# Altium footprint library Разъемы.PcbLib: 291 footprints (part 14 of 19)
Each footprint in its own frame and in the unit in brackets; x right, y up, seen from the top. Pads: shape width x height; smd on the part's side, far side on the other; paste and mask are expansions set on the pad; w line width, h text height; cw(c..) or ccw(c..) is an arc to the next point about the centre after c.
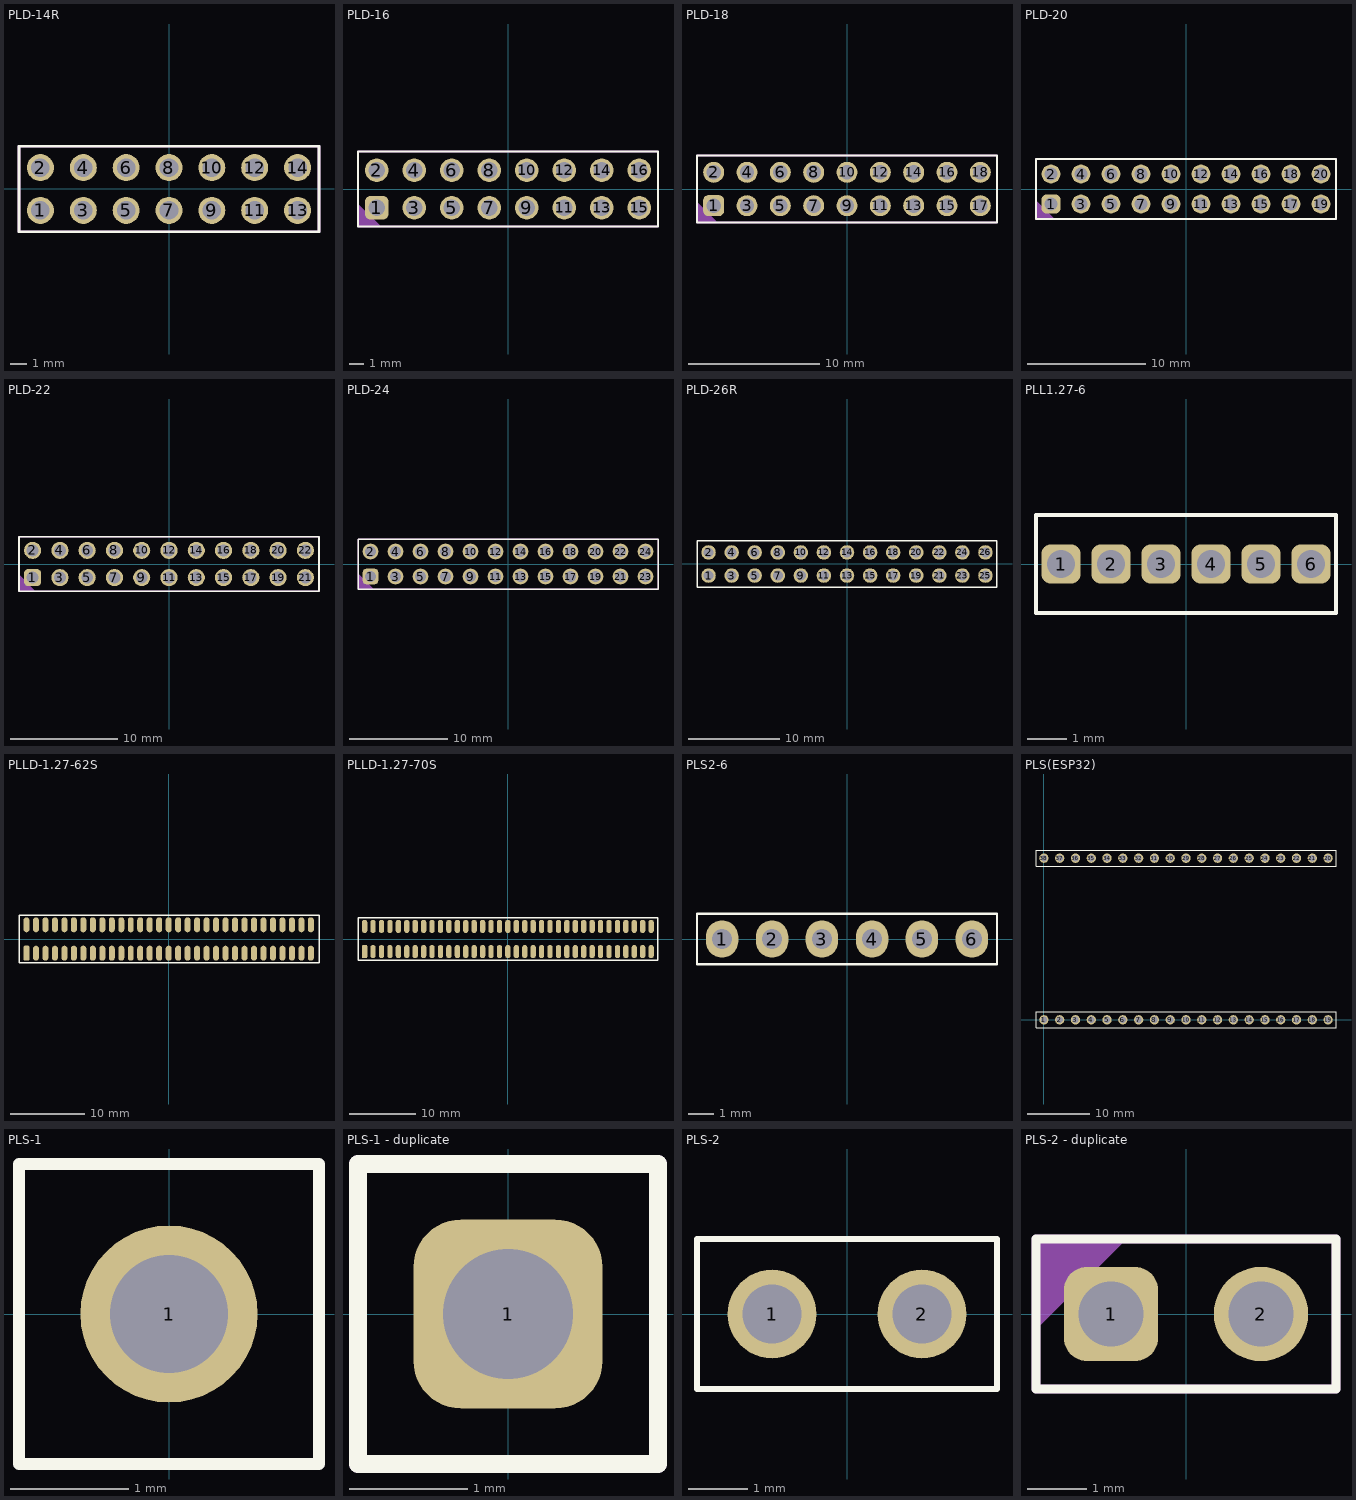
[diagram p13: the footprints below, top view; thin cyan lines are the x and y axes]

## PLD-14R [mm]
height 8
pads (14):
  round 1.6 hole 1.1: 1(-7.62,-1.27) 2(-7.62,1.27) 3(-5.08,-1.27) 4(-5.08,1.27) 5(-2.54,-1.27) 6(-2.54,1.27) 7(0,-1.27) 8(0,1.27) 9(2.54,-1.27) 10(2.54,1.27) 11(5.08,-1.27) 12(5.08,1.27) 13(7.62,-1.27) 14(7.62,1.27)
Top Overlay:
  lines w0.15: -8.89,-2.54 8.89,-2.54 8.89,2.54 -8.89,2.54 -8.89,-2.54
  text "." at -9.5,-1.75 h0.1
Top Designator:
  text ".Designator" at -4.516,-4.594 h0.8
Mechanical 29:
  lines w0.15: -8.89,-2.54 -8.89,2.54 8.89,2.54 8.89,-2.54 -8.89,-2.54
3D body "61301421021.stp": height 5.04, standoff -3.04, extent -8.89,-11.27 8.89,1.63

## PLD-16 [mm]
height 8
pads (16):
  rrect50% 1.6x1.6 hole 1.1: 1(-8.89,-1.27)
  round 1.6 hole 1.1: 2(-8.89,1.27) 3(-6.35,-1.27) 4(-6.35,1.27) 5(-3.81,-1.27) 6(-3.81,1.27) 7(-1.27,-1.27) 8(-1.27,1.27) 9(1.27,-1.27) 10(1.27,1.27) 11(3.81,-1.27) 12(3.81,1.27) 13(6.35,-1.27) 14(6.35,1.27) 15(8.89,-1.27) 16(8.89,1.27)
Top Overlay:
  lines w0.15: -10.16,-2.54 10.16,-2.54 10.16,2.54 -10.16,2.54 -10.16,-2.54
Top Designator:
  text ".Designator" at -3.999,-0.267 h0.8
Mechanical 29:
  region: -10.16,-2.54 -10.16,-1.016 -8.636,-2.54
  lines w0.15: -10.16,-2.54 -10.16,2.54 10.16,2.54 10.16,-2.54 -10.16,-2.54
  text ".Designator" at -2.5,-0.3 h1
3D body "PLS-1.STEP": height 8.5, standoff -3, extent 5.08,-2.54 7.62,0
3D body "PLS-1.STEP": height 8.5, standoff -3, extent 7.62,-2.54 10.16,0
3D body "PLS-1.STEP": height 8.5, standoff -3, extent 7.62,0 10.16,2.54
3D body "PLS-1.STEP": height 8.5, standoff -3, extent 5.08,0 7.62,2.54
3D body "PLS-1.STEP": height 8.5, standoff -3, extent 2.54,-2.54 5.08,0
3D body "PLS-1.STEP": height 8.5, standoff -3, extent 2.54,0 5.08,2.54
3D body "PLS-1.STEP": height 8.5, standoff -3, extent 0,-2.54 2.54,0
3D body "PLS-1.STEP": height 8.5, standoff -3, extent 0,0 2.54,2.54
3D body "PLS-1.STEP": height 8.5, standoff -3, extent -2.54,-2.54 0,0
3D body "PLS-1.STEP": height 8.5, standoff -3, extent -2.54,0 0,2.54
3D body "PLS-1.STEP": height 8.5, standoff -3, extent -5.08,-2.54 -2.54,0
3D body "PLS-1.STEP": height 8.5, standoff -3, extent -5.08,0 -2.54,2.54
3D body "PLS-1.STEP": height 8.5, standoff -3, extent -7.62,-2.54 -5.08,0
3D body "PLS-1.STEP": height 8.5, standoff -3, extent -7.62,0 -5.08,2.54
3D body "PLS-1.STEP": height 8.5, standoff -3, extent -10.16,0 -7.62,2.54
3D body "PLS-1.STEP": height 8.5, standoff -3, extent -10.16,-2.54 -7.62,0

## PLD-18 [mm]
height 8
pads (18):
  rrect50% 1.6x1.6 hole 1.1: 1(-10.16,-1.27)
  round 1.6 hole 1.1: 2(-10.16,1.27) 3(-7.62,-1.27) 4(-7.62,1.27) 5(-5.08,-1.27) 6(-5.08,1.27) 7(-2.54,-1.27) 8(-2.54,1.27) 9(0,-1.27) 10(0,1.27) 11(2.54,-1.27) 12(2.54,1.27) 13(5.08,-1.27) 14(5.08,1.27) 15(7.62,-1.27) 16(7.62,1.27) 17(10.16,-1.27) 18(10.16,1.27)
Top Overlay:
  lines w0.15: -11.43,-2.54 -11.43,2.54 11.43,2.54 11.43,-2.54 -11.43,-2.54
Top Designator:
  text ".Designator" at -3.999,-0.267 h0.8
Mechanical 29:
  region: -11.43,-2.54 -11.43,-1.016 -9.906,-2.54
  lines w0.15: -11.43,-2.54 11.43,-2.54 11.43,2.54 -11.43,2.54 -11.43,-2.54
  text ".Designator" at -3,-0.3 h1
3D body "PLS-1.STEP": height 8.5, standoff -3, extent -11.43,-2.54 -8.89,0
3D body "PLS-1.STEP": height 8.5, standoff -3, extent -11.43,0 -8.89,2.54
3D body "PLS-1.STEP": height 8.5, standoff -3, extent -8.89,0 -6.35,2.54
3D body "PLS-1.STEP": height 8.5, standoff -3, extent -8.89,-2.54 -6.35,0
3D body "PLS-1.STEP": height 8.5, standoff -3, extent -6.35,0 -3.81,2.54
3D body "PLS-1.STEP": height 8.5, standoff -3, extent -6.35,-2.54 -3.81,0
3D body "PLS-1.STEP": height 8.5, standoff -3, extent -3.81,0 -1.27,2.54
3D body "PLS-1.STEP": height 8.5, standoff -3, extent -3.81,-2.54 -1.27,0
3D body "PLS-1.STEP": height 8.5, standoff -3, extent -1.27,0 1.27,2.54
3D body "PLS-1.STEP": height 8.5, standoff -3, extent -1.27,-2.54 1.27,0
3D body "PLS-1.STEP": height 8.5, standoff -3, extent 1.27,0 3.81,2.54
3D body "PLS-1.STEP": height 8.5, standoff -3, extent 1.27,-2.54 3.81,0
3D body "PLS-1.STEP": height 8.5, standoff -3, extent 3.81,0 6.35,2.54
3D body "PLS-1.STEP": height 8.5, standoff -3, extent 6.35,0 8.89,2.54
3D body "PLS-1.STEP": height 8.5, standoff -3, extent 8.89,0 11.43,2.54
3D body "PLS-1.STEP": height 8.5, standoff -3, extent 8.89,-2.54 11.43,0
3D body "PLS-1.STEP": height 8.5, standoff -3, extent 6.35,-2.54 8.89,0
3D body "PLS-1.STEP": height 8.5, standoff -3, extent 3.81,-2.54 6.35,0

## PLD-20 [mm]
height 8
pads (20):
  rrect50% 1.6x1.6 hole 1.1: 1(-11.43,-1.27)
  round 1.6 hole 1.1: 2(-11.43,1.27) 3(-8.89,-1.27) 4(-8.89,1.27) 5(-6.35,-1.27) 6(-6.35,1.27) 7(-3.81,-1.27) 8(-3.81,1.27) 9(-1.27,-1.27) 10(-1.27,1.27) 11(1.27,-1.27) 12(1.27,1.27) 13(3.81,-1.27) 14(3.81,1.27) 15(6.35,-1.27) 16(6.35,1.27) 17(8.89,-1.27) 18(8.89,1.27) 19(11.43,-1.27) 20(11.43,1.27)
Top Overlay:
  lines w0.15: -12.7,-2.54 -12.7,2.54 12.7,2.54 12.7,-2.54 -12.7,-2.54
Top Designator:
  text ".Designator" at -3.999,-0.267 h0.8
Mechanical 29:
  region: -12.7,-2.54 -12.7,-1.016 -11.176,-2.54
  lines w0.15: -12.7,-2.54 12.7,-2.54 12.7,2.54 -12.7,2.54 -12.7,-2.54
  text ".Designator" at -4,-0.3 h1
3D body "PLS-1.STEP": height 8.5, standoff -3, extent -12.7,-2.54 -10.16,0
3D body "PLS-1.STEP": height 8.5, standoff -3, extent -12.7,0 -10.16,2.54
3D body "PLS-1.STEP": height 8.5, standoff -3, extent -10.16,0 -7.62,2.54
3D body "PLS-1.STEP": height 8.5, standoff -3, extent -10.16,-2.54 -7.62,0
3D body "PLS-1.STEP": height 8.5, standoff -3, extent -7.62,0 -5.08,2.54
3D body "PLS-1.STEP": height 8.5, standoff -3, extent -7.62,-2.54 -5.08,0
3D body "PLS-1.STEP": height 8.5, standoff -3, extent -5.08,0 -2.54,2.54
3D body "PLS-1.STEP": height 8.5, standoff -3, extent -5.08,-2.54 -2.54,0
3D body "PLS-1.STEP": height 8.5, standoff -3, extent -2.54,0 0,2.54
3D body "PLS-1.STEP": height 8.5, standoff -3, extent -2.54,-2.54 0,0
3D body "PLS-1.STEP": height 8.5, standoff -3, extent 0,0 2.54,2.54
3D body "PLS-1.STEP": height 8.5, standoff -3, extent 0,-2.54 2.54,0
3D body "PLS-1.STEP": height 8.5, standoff -3, extent 2.54,0 5.08,2.54
3D body "PLS-1.STEP": height 8.5, standoff -3, extent 5.08,0 7.62,2.54
3D body "PLS-1.STEP": height 8.5, standoff -3, extent 7.62,0 10.16,2.54
3D body "PLS-1.STEP": height 8.5, standoff -3, extent 10.16,0 12.7,2.54
3D body "PLS-1.STEP": height 8.5, standoff -3, extent 10.16,-2.54 12.7,0
3D body "PLS-1.STEP": height 8.5, standoff -3, extent 7.62,-2.54 10.16,0
3D body "PLS-1.STEP": height 8.5, standoff -3, extent 5.08,-2.54 7.62,0
3D body "PLS-1.STEP": height 8.5, standoff -3, extent 2.54,-2.54 5.08,0

## PLD-22 [mm]
height 8
pads (22):
  rrect50% 1.6x1.6 hole 1.1: 1(-12.7,-1.27)
  round 1.6 hole 1.1: 2(-12.7,1.27) 3(-10.16,-1.27) 4(-10.16,1.27) 5(-7.62,-1.27) 6(-7.62,1.27) 7(-5.08,-1.27) 8(-5.08,1.27) 9(-2.54,-1.27) 10(-2.54,1.27) 11(0,-1.27) 12(0,1.27) 13(2.54,-1.27) 14(2.54,1.27) 15(5.08,-1.27) 16(5.08,1.27) 17(7.62,-1.27) 18(7.62,1.27) 19(10.16,-1.27) 20(10.16,1.27) 21(12.7,-1.27) 22(12.7,1.27)
Top Overlay:
  lines w0.15: -13.97,-2.54 -13.97,2.54 13.97,2.54 13.97,-2.54 -13.97,-2.54
Top Designator:
  text ".Designator" at -3.999,-0.267 h0.8
Mechanical 29:
  region: -13.97,-2.54 -13.97,-1.016 -12.446,-2.54
  lines w0.15: -13.97,-2.54 13.97,-2.54 13.97,2.54 -13.97,2.54 -13.97,-2.54
  text ".Designator" at -3.5,-0.3 h1
3D body "PLS-1.STEP": height 8.5, standoff -3, extent -13.97,-2.54 -11.43,0
3D body "PLS-1.STEP": height 8.5, standoff -3, extent -13.97,0 -11.43,2.54
3D body "PLS-1.STEP": height 8.5, standoff -3, extent -11.43,0 -8.89,2.54
3D body "PLS-1.STEP": height 8.5, standoff -3, extent -11.43,-2.54 -8.89,0
3D body "PLS-1.STEP": height 8.5, standoff -3, extent -8.89,0 -6.35,2.54
3D body "PLS-1.STEP": height 8.5, standoff -3, extent -8.89,-2.54 -6.35,0
3D body "PLS-1.STEP": height 8.5, standoff -3, extent -6.35,0 -3.81,2.54
3D body "PLS-1.STEP": height 8.5, standoff -3, extent -6.35,-2.54 -3.81,0
3D body "PLS-1.STEP": height 8.5, standoff -3, extent -3.81,0 -1.27,2.54
3D body "PLS-1.STEP": height 8.5, standoff -3, extent -3.81,-2.54 -1.27,0
3D body "PLS-1.STEP": height 8.5, standoff -3, extent -1.27,0 1.27,2.54
3D body "PLS-1.STEP": height 8.5, standoff -3, extent -1.27,-2.54 1.27,0
3D body "PLS-1.STEP": height 8.5, standoff -3, extent 1.27,0 3.81,2.54
3D body "PLS-1.STEP": height 8.5, standoff -3, extent 3.81,0 6.35,2.54
3D body "PLS-1.STEP": height 8.5, standoff -3, extent 6.35,0 8.89,2.54
3D body "PLS-1.STEP": height 8.5, standoff -3, extent 8.89,0 11.43,2.54
3D body "PLS-1.STEP": height 8.5, standoff -3, extent 11.43,0 13.97,2.54
3D body "PLS-1.STEP": height 8.5, standoff -3, extent 11.43,-2.54 13.97,0
3D body "PLS-1.STEP": height 8.5, standoff -3, extent 8.89,-2.54 11.43,0
3D body "PLS-1.STEP": height 8.5, standoff -3, extent 6.35,-2.54 8.89,0
3D body "PLS-1.STEP": height 8.5, standoff -3, extent 3.81,-2.54 6.35,0
3D body "PLS-1.STEP": height 8.5, standoff -3, extent 1.27,-2.54 3.81,0

## PLD-24 [mm]
height 8
pads (24):
  rrect50% 1.6x1.6 hole 1.1: 1(-13.97,-1.27)
  round 1.6 hole 1.1: 2(-13.97,1.27) 3(-11.43,-1.27) 4(-11.43,1.27) 5(-8.89,-1.27) 6(-8.89,1.27) 7(-6.35,-1.27) 8(-6.35,1.27) 9(-3.81,-1.27) 10(-3.81,1.27) 11(-1.27,-1.27) 12(-1.27,1.27) 13(1.27,-1.27) 14(1.27,1.27) 15(3.81,-1.27) 16(3.81,1.27) 17(6.35,-1.27) 18(6.35,1.27) 19(8.89,-1.27) 20(8.89,1.27) 21(11.43,-1.27) 22(11.43,1.27) 23(13.97,-1.27) 24(13.97,1.27)
Top Overlay:
  lines w0.15: -15.24,-2.54 15.24,-2.54 15.24,2.54 -15.24,2.54 -15.24,-2.54
Top Designator:
  text ".Designator" at -3.999,-0.267 h0.8
Mechanical 29:
  region: -15.24,-2.5 -15.24,-0.976 -13.716,-2.5
  lines w0.15: -15.24,-2.54 -15.24,2.54 15.24,2.54 15.24,-2.54 -15.24,-2.54
3D body "PLS-1.STEP": height 8.5, standoff -3, extent 0,-2.54 2.54,0
3D body "PLS-1.STEP": height 8.5, standoff -3, extent 2.54,-2.54 5.08,0
3D body "PLS-1.STEP": height 8.5, standoff -3, extent 5.08,-2.54 7.62,0
3D body "PLS-1.STEP": height 8.5, standoff -3, extent 7.62,-2.54 10.16,0
3D body "PLS-1.STEP": height 8.5, standoff -3, extent 10.16,-2.54 12.7,0
3D body "PLS-1.STEP": height 8.5, standoff -3, extent 12.7,-2.54 15.24,0
3D body "PLS-1.STEP": height 8.5, standoff -3, extent 12.7,0 15.24,2.54
3D body "PLS-1.STEP": height 8.5, standoff -3, extent 10.16,0 12.7,2.54
3D body "PLS-1.STEP": height 8.5, standoff -3, extent 7.62,0 10.16,2.54
3D body "PLS-1.STEP": height 8.5, standoff -3, extent 5.08,0 7.62,2.54
3D body "PLS-1.STEP": height 8.5, standoff -3, extent 2.54,0 5.08,2.54
3D body "PLS-1.STEP": height 8.5, standoff -3, extent 0,0 2.54,2.54
3D body "PLS-1.STEP": height 8.5, standoff -3, extent -2.54,-2.54 0,0
3D body "PLS-1.STEP": height 8.5, standoff -3, extent -2.54,0 0,2.54
3D body "PLS-1.STEP": height 8.5, standoff -3, extent -5.08,-2.54 -2.54,0
3D body "PLS-1.STEP": height 8.5, standoff -3, extent -5.08,0 -2.54,2.54
3D body "PLS-1.STEP": height 8.5, standoff -3, extent -7.62,-2.54 -5.08,0
3D body "PLS-1.STEP": height 8.5, standoff -3, extent -7.62,0 -5.08,2.54
3D body "PLS-1.STEP": height 8.5, standoff -3, extent -10.16,-2.54 -7.62,0
3D body "PLS-1.STEP": height 8.5, standoff -3, extent -10.16,0 -7.62,2.54
3D body "PLS-1.STEP": height 8.5, standoff -3, extent -12.7,-2.54 -10.16,0
3D body "PLS-1.STEP": height 8.5, standoff -3, extent -12.7,0 -10.16,2.54
3D body "PLS-1.STEP": height 8.5, standoff -3, extent -15.24,0 -12.7,2.54
3D body "PLS-1.STEP": height 8.5, standoff -3, extent -15.24,-2.54 -12.7,0

## PLD-26R [mm]
pads (26):
  round 1.6 hole 1.1: 1(-15.24,-1.29) 2(-15.24,1.25) 3(-12.7,-1.29) 4(-12.7,1.25) 5(-10.16,-1.29) 6(-10.16,1.25) 7(-7.62,-1.29) 8(-7.62,1.25) 9(-5.08,-1.29) 10(-5.08,1.25) 11(-2.54,-1.29) 12(-2.54,1.25) 13(0,-1.29) 14(0,1.25) 15(2.54,-1.29) 16(2.54,1.25) 17(5.08,-1.29) 18(5.08,1.25) 19(7.62,-1.29) 20(7.62,1.25) 21(10.16,-1.29) 22(10.16,1.25) 23(12.7,-1.29) 24(12.7,1.25) 25(15.24,-1.29) 26(15.24,1.25)
Top Overlay:
  lines w0.15: -16.51,-0.02 -16.51,-2.56 ; -13.97,-2.56 -16.51,-2.56 ; -16.51,-2.56 -16.51,2.52 16.51,2.52 16.51,-2.56 -16.51,-2.56
  text "." at -17.5,-1.25 h0.1
Top Designator:
  text ".Designator" at -4.706,-4.623 h0.8
3D body "61302621021 (rev1).stp": height 5.08, standoff -3, extent -16.502,-11.307 16.518,1.593

## PLL1.27-6 [mm]
height 4.6
pads (6):
  rrect50% 1x1 hole 0.7: 1(-3.175,0) 2(-1.905,0) 3(-0.635,0) 4(0.635,0) 5(1.905,0) 6(3.175,0)
Top Overlay:
  lines w0.1: -3.81,-1.25 -3.81,1.25 3.81,1.25 3.81,-1.25 -3.81,-1.25
3D body "PLL1.27-6.STEP": height 4.6, standoff -2.6, extent -3.81,-1.2 3.81,1.3

## PLLD-1.27-62S [mm]
pads (62):
  rrect50% 0.8x2 smd: 1(-19.05,-1.9)
  oval 0.8x2 smd: 2(-19.05,1.9) 3(-17.78,-1.9) 4(-17.78,1.9) 5(-16.51,-1.9) 6(-16.51,1.9) 7(-15.24,-1.9) 8(-15.24,1.9) 9(-13.97,-1.9) 10(-13.97,1.9) 11(-12.7,-1.9) 12(-12.7,1.9) 13(-11.43,-1.9) 14(-11.43,1.9) 15(-10.16,-1.9) 16(-10.16,1.9) 17(-8.89,-1.9) 18(-8.89,1.9) 19(-7.62,-1.9) 20(-7.62,1.9) 21(-6.35,-1.9) 22(-6.35,1.9) 23(-5.08,-1.9) 24(-5.08,1.9) 25(-3.81,-1.9) 26(-3.81,1.9) 27(-2.54,-1.9) 28(-2.54,1.9) 29(-1.27,-1.9) 30(-1.27,1.9) 31(0,-1.9) 32(0,1.9) 33(1.27,-1.9) 34(1.27,1.9) 35(2.54,-1.9) 36(2.54,1.9) 37(3.81,-1.9) 38(3.81,1.9) 39(5.08,-1.9) 40(5.08,1.9) 41(6.35,-1.9) 42(6.35,1.9) 43(7.62,-1.9) 44(7.62,1.9) 45(8.89,-1.9) 46(8.89,1.9) 47(10.16,-1.9) 48(10.16,1.9) 49(11.43,-1.9) 50(11.43,1.9) 51(12.7,-1.9) 52(12.7,1.9) 53(13.97,-1.9) 54(13.97,1.9) 55(15.24,-1.9) 56(15.24,1.9) 57(16.51,-1.9) 58(16.51,1.9) 59(17.78,-1.9) 60(17.78,1.9) 61(19.05,-1.9) 62(19.05,1.9)
Top Overlay:
  lines w0.2: -20.04,3.2 -20.04,-3.2 20.14,-3.2 20.14,3.2 4.596,3.2 -19.034,3.2 -20.034,3.2
  text "." at -19.25,-4 h0.1
3D body "User Library-PLLD1_27-xx-S (1).step": height 3.9, standoff 0, extent -19.685,-2.5 19.685,2.5

## PLLD-1.27-70S [mm]
pads (70):
  rrect50% 0.8x2 smd: 1(-21.59,-1.9)
  oval 0.8x2 smd: 2(-21.59,1.9) 3(-20.32,-1.9) 4(-20.32,1.9) 5(-19.05,-1.9) 6(-19.05,1.9) 7(-17.78,-1.9) 8(-17.78,1.9) 9(-16.51,-1.9) 10(-16.51,1.9) 11(-15.24,-1.9) 12(-15.24,1.9) 13(-13.97,-1.9) 14(-13.97,1.9) 15(-12.7,-1.9) 16(-12.7,1.9) 17(-11.43,-1.9) 18(-11.43,1.9) 19(-10.16,-1.9) 20(-10.16,1.9) 21(-8.89,-1.9) 22(-8.89,1.9) 23(-7.62,-1.9) 24(-7.62,1.9) 25(-6.35,-1.9) 26(-6.35,1.9) 27(-5.08,-1.9) 28(-5.08,1.9) 29(-3.81,-1.9) 30(-3.81,1.9) 31(-2.54,-1.9) 32(-2.54,1.9) 33(-1.27,-1.9) 34(-1.27,1.9) 35(0,-1.9) 36(0,1.9) 37(1.27,-1.9) 38(1.27,1.9) 39(2.54,-1.9) 40(2.54,1.9) 41(3.81,-1.9) 42(3.81,1.9) 43(5.08,-1.9) 44(5.08,1.9) 45(6.35,-1.9) 46(6.35,1.9) 47(7.62,-1.9) 48(7.62,1.9) 49(8.89,-1.9) 50(8.89,1.9) 51(10.16,-1.9) 52(10.16,1.9) 53(11.43,-1.9) 54(11.43,1.9) 55(12.7,-1.9) 56(12.7,1.9) 57(13.97,-1.9) 58(13.97,1.9) 59(15.24,-1.9) 60(15.24,1.9) 61(16.51,-1.9) 62(16.51,1.9) 63(17.78,-1.9) 64(17.78,1.9) 65(19.05,-1.9) 66(19.05,1.9) 67(20.32,-1.9) 68(20.32,1.9) 69(21.59,-1.9) 70(21.59,1.9)
Top Overlay:
  lines w0.2: -22.58,3.2 -22.58,-3.2 22.62,-3.2 22.62,3.2 ; -22.574,3.2 -21.574,3.2 2.056,3.2 22.626,3.2
  text "." at -21.75,-3.75 h0.1
3D body "User Library-PLLD1_27-xx-S.step": height 3.9, standoff 0, extent -22.225,-2.5 22.225,2.5

## PLS2-6 [mm]
height 6
pads (6):
  oval 1.3x1.5 hole 0.8: 1(-5,0) 2(-3,0) 3(-1,0) 4(1,0) 5(3,0) 6(5,0)
Top Overlay:
  lines w0.1: -6,-1 -6,1 6,1 6,-1 -6,-1
3D body "PLS2-6.STEP": height 8, standoff -3, extent -6,-1 6,1

## PLS(ESP32) [mm]
pads (38):
  round 1.5 hole 1: 1(0,0) 2(2.54,0) 3(5.08,0) 4(7.62,0) 5(10.16,0) 6(12.7,0) 7(15.24,0) 8(17.78,0) 9(20.32,0) 10(22.86,0) 11(25.4,0) 12(27.94,0) 13(30.48,0) 14(33.02,0) 15(35.56,0) 16(38.1,0) 17(40.64,0) 18(43.18,0) 19(45.72,0) 20(45.72,26) 21(43.18,26) 22(40.64,26) 23(38.1,26) 24(35.56,26) 25(33.02,26) 26(30.48,26) 27(27.94,26) 28(25.4,26) 29(22.86,26) 30(20.32,26) 31(17.78,26) 32(15.24,26) 33(12.7,26) 34(10.16,26) 35(7.62,26) 36(5.08,26) 37(2.54,26) 38(0,26)
Top Overlay:
  lines w0.1: -1.27,-1.27 46.99,-1.27 46.99,1.27 -1.27,1.27 -1.27,-1.27 ; -1.27,24.73 46.99,24.73 46.99,27.27 -1.27,27.27 -1.27,24.73

## PLS-1 [mm]
height 6
pads (1):
  round 1.5 hole 1: 1(0,0)
Top Overlay:
  lines w0.1: -1.27,-1.27 -1.27,1.27 1.27,1.27 1.27,-1.27 -1.27,-1.27
3D body "PLS-1.STEP": height 8.54, standoff -3, extent -1.27,-1.27 1.27,1.27

## PLS-1 - duplicate [mm]
pads (1):
  rrect50% 1.6x1.6 hole 1.1: 1(0,0)
Top Overlay:
  lines w0.15: -1.27,-1.27 -1.27,1.27 1.27,1.27 1.27,-1.27 -1.27,-1.27
Top Designator:
  text ".Designator" at -3.999,-0.267 h0.8
Mechanical 29:
  lines w0.15: -1.27,-1.27 1.27,-1.27 1.27,1.27 -1.27,1.27 -1.27,-1.27

## PLS-2 [mm]
height 6
pads (2):
  round 1.5 hole 1: 1(-1.27,0) 2(1.27,0)
Top Overlay:
  lines w0.1: -2.54,-1.27 2.54,-1.27 2.54,1.27 -2.54,1.27 -2.54,-1.27
3D body "PLD-2.STEP": height 8.54, standoff -3, extent -2.54,-1.27 2.54,1.27

## PLS-2 - duplicate [mm]
pads (2):
  rrect50% 1.6x1.6 hole 1.1: 1(-1.27,0)
  round 1.6 hole 1.1: 2(1.27,0)
Top Overlay:
  lines w0.15: -2.54,-1.27 2.54,-1.27 2.54,1.27 -2.54,1.27 -2.54,-1.27
Top Designator:
  text ".Designator" at -2.334,-0.267 h0.8
Mechanical 29:
  region: -2.54,1.27 -1.016,1.27 -2.54,-0.254
  lines w0.15: -2.54,-1.27 -2.54,1.27 2.54,1.27 2.54,-1.27 -2.54,-1.27
  text ".Designator" at -1.5,-0.8 h1
3D body "PLS-1.STEP": height 8.5, standoff -3, extent 0,-1.27 2.54,1.27
3D body "PLS-1.STEP": height 8.5, standoff -3, extent -2.54,-1.27 0,1.27